# Altium footprint library Miscellaneous THD.PcbLib: 216 footprints (part 3 of 15) (continued)
## EPT_103-80004 [mm] "Right Angled Connector; DIN 41612, Type C/3, Thru-Hole; Rows a+b+c, 30 Male Contacts" (continued)
Mechanical 14:
  circle w0.1: c2.54,5.08 r1.25
  circle w0.1: c2.54,-27.94 r1.25
  lines w0.1: 2.04,-24.93 -0.31,-24.93 -0.31,-30.93 7.74,-30.93 7.74,-27.28 12.64,-27.28 12.64,4.32 7.74,4.32 7.74,8.07 -0.31,8.07 -0.31,2.07 2.04,2.07 ; 5.59,-30.93 5.59,8.07 ; 5.59,-25.14 2.04,-25.14 2.04,2.18 5.59,2.18
  text "b" at -2.94,1.48 h1.2
  text "c" at -5.465,1.48 h1.2
  text "10" at -8.327,-23.435 h1.2
  text "1" at -6.919,-0.725 h1.2
  text "5" at -7.304,-10.76 h1.2
3D body "EPT_103-80004.stp": height 9.35, standoff -3, extent -5.38,-30.93 12.64,8.07

## EPT_111-40064 [mm] "DIN 41612, Type G, 64 Contacts, Rows z/f+b+d, Performance level 2, Right Angle Male Connector"
height 16.4
pads (66):
  round 1.7 hole 1: b2(2.54,-2.54) b4(2.54,-7.62) b6(2.54,-12.7) b8(2.54,-17.78) b10(2.54,-22.86) b12(2.54,-27.94) b14(2.54,-33.02) b16(2.54,-38.1) b18(2.54,-43.18) b20(2.54,-48.26) b22(2.54,-53.34) b24(2.54,-58.42) b26(2.54,-63.5) b28(2.54,-68.58) b30(2.54,-73.66) b32(2.54,-78.74) d2(0,-2.54) d4(0,-7.62) d6(0,-12.7) d8(0,-17.78) d10(0,-22.86) d12(0,-27.94) d14(0,-33.02) d16(0,-38.1) d18(0,-43.18) d20(0,-48.26) d22(0,-53.34) d24(0,-58.42) d26(0,-63.5) d28(0,-68.58) d30(0,-73.66) d32(0,-78.74) f2(5.08,0) f4(5.08,-5.08) f6(5.08,-10.16) f8(5.08,-15.24) f10(5.08,-20.32) f12(5.08,-25.4) f14(5.08,-30.48) f16(5.08,-35.56) f18(5.08,-40.64) f20(5.08,-45.72) f22(5.08,-50.8) f24(5.08,-55.88) f26(5.08,-60.96) f28(5.08,-66.04) f30(5.08,-71.12) f32(5.08,-76.2) z2(5.08,-2.54) z4(5.08,-7.62) z6(5.08,-12.7) z8(5.08,-17.78) z10(5.08,-22.86) z12(5.08,-27.94) z14(5.08,-33.02) z16(5.08,-38.1) z18(5.08,-43.18) z20(5.08,-48.26) z22(5.08,-53.34) z24(5.08,-58.42) z26(5.08,-63.5) z28(5.08,-68.58) z30(5.08,-73.66) z32(5.08,-78.74)
  round 3.5 / inner round 3.5 / far side round 5.1 hole 2.8: MTG1(7.62,5.08) MTG2(7.62,-83.82)
Top Overlay:
  lines w0.2: -0.77,-79.725 -0.77,-81.32 5.13,-81.32 ; -0.77,-1.555 -0.77,2.58 5.13,2.58 ; 5.13,-84.568 5.13,-86.37 7.113,-86.37 ; 5.13,-83.072 5.13,-81.32 ; 5.13,4.332 5.13,2.58 ; 5.13,5.828 5.13,7.63 7.113,7.63 ; 6.906,-81.32 5.13,-81.32 ; 6.906,2.58 5.13,2.58 ; 8.127,-86.37 12.03,-86.37 12.03,-83.12 ; 8.127,7.63 12.03,7.63 12.03,4.38 ; 8.334,-81.32 12.03,-81.32 12.03,-83.12 ; 8.334,2.58 12.03,2.58 12.03,4.38 ; 12.03,-83.12 21.33,-83.12 21.33,-80.32 19.83,-80.32 19.83,1.58 21.33,1.58 21.33,4.38 12.03,4.38
  text "30" at -3.203,-74.295 h1.2
  text "10" at -3.06,-23.495 h1.2
  text "32" at -3.203,-79.375 h1.2
  text "b" at 2.047,1.34 h1.2
  text "z/f" at 4.588,1.34 h1.2
  text "d" at -0.493,1.34 h1.2
  text "2" at -2.145,-3.05 h1.2
  text "20" at -3.21,-48.87 h1.2
Mechanical 8:
  drawing of 269 lines, arcs and shapes, not listed
Mechanical 14:
  lines w0.1: 5.13,-81.32 5.13,-86.37 12.03,-86.37 12.03,-83.12 ; 5.13,-81.32 -0.77,-81.32 -0.77,2.58 5.13,2.58 ; 5.13,-81.32 12.03,-81.32 12.03,-83.12 ; 5.13,2.58 5.13,7.63 12.03,7.63 12.03,4.38 ; 5.13,2.58 12.03,2.58 12.03,4.38 ; 12.03,-83.12 21.33,-83.12 21.33,-80.32 19.83,-80.32 19.83,1.58 21.33,1.58 21.33,4.38 12.03,4.38
  text "32" at -3.203,-79.375 h1.2
  text "10" at -3.06,-23.495 h1.2
  text "30" at -3.203,-74.295 h1.2
  text "2" at -2.145,-3.05 h1.2
  text "20" at -3.21,-48.87 h1.2
3D body "EPT_111-40064.stp": height 16.4, standoff -3.4, extent -0.77,-86.37 21.33,7.63

## EPT_112-40064 [mm] "DIN 41612, Type G, 64 Contacts, Rows z+b+d+f, Performance level 2, Straight Femalele Connector"
height 20
pads (66):
  round 2.3 hole 1.6: b2(5.08,0) b4(5.08,-5.08) b6(5.08,-10.16) b8(5.08,-15.24) b10(5.08,-20.32) b12(5.08,-25.4) b14(5.08,-30.48) b16(5.08,-35.56) b18(5.08,-40.64) b20(5.08,-45.72) b22(5.08,-50.8) b24(5.08,-55.88) b26(5.08,-60.96) b28(5.08,-66.04) b30(5.08,-71.12) b32(5.08,-76.2) d2(10.16,0) d4(10.16,-5.08) d6(10.16,-10.16) d8(10.16,-15.24) d10(10.16,-20.32) d12(10.16,-25.4) d14(10.16,-30.48) d16(10.16,-35.56) d18(10.16,-40.64) d20(10.16,-45.72) d22(10.16,-50.8) d24(10.16,-55.88) d26(10.16,-60.96) d28(10.16,-66.04) d30(10.16,-71.12) d32(10.16,-76.2) f2(15.24,0) f4(15.24,-5.08) f6(15.24,-10.16) f8(15.24,-15.24) f10(15.24,-20.32) f12(15.24,-25.4) f14(15.24,-30.48) f16(15.24,-35.56) f18(15.24,-40.64) f20(15.24,-45.72) f22(15.24,-50.8) f24(15.24,-55.88) f26(15.24,-60.96) f28(15.24,-66.04) f30(15.24,-71.12) f32(15.24,-76.2) z2(0,0) z4(0,-5.08) z6(0,-10.16) z8(0,-15.24) z10(0,-20.32) z12(0,-25.4) z14(0,-30.48) z16(0,-35.56) z18(0,-40.64) z20(0,-45.72) z22(0,-50.8) z24(0,-55.88) z26(0,-60.96) z28(0,-66.04) z30(0,-71.12) z32(0,-76.2)
  round 3.5 / inner round 3.5 / far side round 5.1 hole 2.8: MTG1(4.78,8.17) MTG2(4.78,-81.83)
Top Overlay:
  lines w0.2: -1.08,-77.312 -1.08,-79.03 ; -1.08,1.112 -1.08,5.37 ; -0.58,-77.637 -0.58,-78.53 ; -0.58,1.437 -0.58,4.87 ; 0,-77.75 0,-78.53 ; 0,1.55 0,4.87 ; 0.453,-79.03 0,-78.53 ; 0.453,5.37 0,4.87 ; 0.77,-79.03 0.77,-77.545 ; 0.77,1.345 0.77,5.37 ; 1.77,-79.03 1.77,5.37 ; 2.087,-79.03 2.54,-78.53 ; 2.087,5.37 2.54,4.87 ; 3.76,-84.33 -2.28,-84.33 -2.28,10.67 3.76,10.67 ; 3.81,-77.089 3.81,-78.53 ; 3.81,0.889 3.81,4.87 ; 4.263,-79.03 3.81,-78.53 ; 4.263,5.37 3.81,4.87 ; 4.58,-79.03 4.58,-77.667 ; 4.58,1.467 4.58,5.37 ; 5.58,-79.03 5.58,-77.667 ; 5.58,1.467 5.58,5.37 ; 5.8,-84.33 17.52,-84.33 17.52,10.67 5.8,10.67 ; 5.897,-79.03 6.35,-78.53 ; 5.897,5.37 6.35,4.87 ; 6.35,-77.089 6.35,-78.53 ; 6.35,0.889 6.35,4.87 ; 8.073,-79.03 7.62,-78.53 ; 8.073,5.37 7.62,4.87 ; 8.39,-79.03 8.39,5.37 ; 9.39,-79.03 9.39,-77.545 ; 9.39,1.345 9.39,5.37 ; 9.707,-79.03 10.16,-78.53 ; 9.707,5.37 10.16,4.87 ; 10.16,-77.75 10.16,-78.53 ; 10.16,1.55 10.16,4.87 ; 13.153,-79.03 12.7,-78.53 ; 13.153,5.37 12.7,4.87 ; 13.47,-79.03 13.47,5.37 ; 14.47,-79.03 14.47,-77.545 ; 14.47,1.345 14.47,5.37 ; 14.787,-79.03 15.24,-78.53 ; 14.787,5.37 15.24,4.87 ; 15.24,-77.75 15.24,-78.53 ; 15.24,1.55 15.24,4.87 ; 15.82,-77.637 15.82,-78.53 ; 15.82,1.437 15.82,4.87 ; 16.32,-77.312 16.32,-79.03 ; 16.32,1.112 16.32,5.37 ; -1.08,-79.03 -0.58,-78.53 ; -1.08,-79.03 -0.58,-78.53 ; -1.08,-79.03 16.32,-79.03 ; -1.08,5.37 -0.58,4.87 ; -1.08,5.37 16.32,5.37 ; -0.58,-78.53 0,-78.53 ; -0.58,4.87 0,4.87 ; 2.54,-78.53 2.54,4.87 ; 2.54,-78.53 3.81,-78.53 ; 2.54,4.87 3.81,4.87 ; 2.54,4.87 3.81,4.87 ; 6.35,-78.53 7.62,-78.53 ; 6.35,4.87 7.62,4.87 ; 7.62,-78.53 7.62,4.87 ; 10.16,-78.53 12.7,-78.53 ; 10.16,4.87 12.7,4.87 ; 12.7,-78.53 12.7,4.87 ; 15.24,-78.53 15.82,-78.53 ; 15.24,4.87 15.82,4.87 ; 15.82,-78.53 16.32,-79.03 ; 15.82,4.87 16.32,5.37
  text "b" at 7.545,5.925 h1.2
  text "f" at 15.125,6 h1.2
  text "d" at 10.07,5.925 h1.2
  text "z" at -0.58,6.125 h1.2
  text "5" at -3.732,-8.305 h1.2
  text "30" at -5.002,-71.805 h1.2
  text "25" at -5.002,-59.105 h1.2
  text "20" at -5.002,-46.405 h1.2
  text "15" at -4.685,-33.705 h1.2
  text "10" at -4.685,-21.005 h1.2
  text "32" at -5.002,-76.885 h1.2
  text "1" at -3.415,1.855 h1.2
Mechanical 8:
  drawing of 269 lines, arcs and shapes, not listed
Mechanical 14:
  lines w0.1: 0.453,-79.03 0,-78.53 ; 0.453,5.37 0,4.87 ; 0.77,-79.03 0.77,5.37 ; 1.77,-79.03 1.77,5.37 ; 2.087,-79.03 2.54,-78.53 ; 2.087,5.37 2.54,4.87 ; 4.263,-79.03 3.81,-78.53 ; 4.263,5.37 3.81,4.87 ; 4.58,-79.03 4.58,5.37 ; 5.58,-79.03 5.58,5.37 ; 5.897,-79.03 6.35,-78.53 ; 5.897,5.37 6.35,4.87 ; 8.073,-79.03 7.62,-78.53 ; 8.073,5.37 7.62,4.87 ; 8.39,-79.03 8.39,5.37 ; 9.39,-79.03 9.39,5.37 ; 9.707,-79.03 10.16,-78.53 ; 9.707,5.37 10.16,4.87 ; 13.153,-79.03 12.7,-78.53 ; 13.153,5.37 12.7,4.87 ; 13.47,-79.03 13.47,5.37 ; 14.47,-79.03 14.47,5.37 ; 14.787,-79.03 15.24,-78.53 ; 14.787,5.37 15.24,4.87 ; -1.08,-79.03 -0.58,-78.53 ; -1.08,-79.03 -0.58,-78.53 ; -1.08,-79.03 -1.08,5.37 ; -1.08,-79.03 16.32,-79.03 ; -1.08,5.37 -0.58,4.87 ; -1.08,5.37 16.32,5.37 ; -0.58,-78.53 0,-78.53 ; -0.58,-78.53 -0.58,4.87 ; -0.58,4.87 0,4.87 ; 0,-78.53 0,4.87 ; 2.54,-78.53 2.54,4.87 ; 2.54,-78.53 3.81,-78.53 ; 2.54,4.87 3.81,4.87 ; 2.54,4.87 3.81,4.87 ; 3.81,-78.53 3.81,4.87 ; 6.35,-78.53 6.35,4.87 ; 6.35,-78.53 7.62,-78.53 ; 6.35,4.87 7.62,4.87 ; 7.62,-78.53 7.62,4.87 ; 10.16,-78.53 12.7,-78.53 ; 10.16,-78.53 10.16,4.87 ; 10.16,4.87 12.7,4.87 ; 12.7,-78.53 12.7,4.87 ; 15.24,-78.53 15.82,-78.53 ; 15.24,-78.53 15.24,4.87 ; 15.24,4.87 15.82,4.87 ; 15.82,-78.53 16.32,-79.03 ; 15.82,-78.53 15.82,4.87 ; 15.82,4.87 16.32,5.37 ; 16.32,-79.03 16.32,5.37 ; -2.28,-84.33 17.52,-84.33 17.52,10.67 -2.28,10.67 -2.28,-84.33
  text "z" at -0.58,6.125 h1.2
  text "d" at 10.07,5.925 h1.2
  text "f" at 15.125,6 h1.2
  text "b" at 7.545,5.925 h1.2
  text "1" at -3.415,1.855 h1.2
  text "32" at -5.002,-76.885 h1.2
  text "10" at -4.685,-21.005 h1.2
  text "15" at -4.685,-33.705 h1.2
  text "20" at -5.002,-46.405 h1.2
  text "25" at -5.002,-59.105 h1.2
  text "30" at -5.002,-71.805 h1.2
  text "5" at -3.732,-8.305 h1.2
  text "5" at -3.732,-8.305 h1.2
  text "30" at -5.002,-71.805 h1.2
  text "25" at -5.002,-59.105 h1.2
  text "20" at -5.002,-46.405 h1.2
  text "15" at -4.685,-33.705 h1.2
  text "10" at -4.685,-21.005 h1.2
  text "32" at -5.002,-76.885 h1.2
  text "1" at -3.415,1.855 h1.2
  text "1" at -3.415,1.855 h1.2
  text "32" at -5.002,-76.885 h1.2
  text "10" at -4.685,-21.005 h1.2
  text "15" at -4.685,-33.705 h1.2
  text "20" at -5.002,-46.405 h1.2
  text "25" at -5.002,-59.105 h1.2
  text "30" at -5.002,-71.805 h1.2
  text "5" at -3.732,-8.305 h1.2
3D body "EPT_112-40064.stp": height 20, standoff -4.5, extent -2.28,-84.33 17.52,10.67

## EPT_113-40010 [mm] "DIN 41612, DIN41612 Type H, 11 Positions, Right Angle Male Connector, Pitch 7.62 mm"
height 11
pads (13):
  round 2.3 hole 1.6: 2(0,0) 5(0,-7.62) 8(0,-15.24) 11(0,-22.86) 14(0,-30.48) 17(0,-38.1) 20(0,-45.72) 23(0,-53.34) 26(0,-60.96) 29(0,-68.58) 32(0,-76.2)
  round 3.5 / inner round 3.5 / far side round 5.1 hole 2.8: MTG1(12.7,7.62) MTG2(12.7,-81.28)
Top Overlay:
  lines w0.2: 10.3,-82.568 10.3,-83.83 17.6,-83.83 17.6,-80.83 27,-80.83 27,7.17 17.6,7.17 17.6,10.17 10.3,10.17 10.3,8.907 ; 10.3,-80.043 10.3,-78.78 ; 10.3,5.12 10.3,6.382 ; 11.5,-78.78 -1.6,-78.78 -1.6,5.12 11.5,5.12 ; 14,-78.78 15.7,-78.78 15.7,-83.83 ; 14,5.12 15.7,5.12 15.7,10.17 ; 27,-66.1 25.3,-66.1 25.3,-65.05 27,-65.05 ; 27,-61.95 25.3,-61.95 25.3,-60.9 27,-60.9 ; 27,-50.86 25.3,-50.86 25.3,-49.81 27,-49.81 ; 27,-46.71 25.3,-46.71 25.3,-45.66 27,-45.66 ; 27,-35.62 25.3,-35.62 25.3,-34.57 27,-34.57 ; 27,-31.47 25.3,-31.47 25.3,-30.42 27,-30.42 ; 27,-20.38 25.3,-20.38 25.3,-19.33 27,-19.33 ; 27,-16.23 25.3,-16.23 25.3,-15.18 27,-15.18
  text "32" at -3.78,-76.835 h1.2
  text "29" at -3.78,-69.215 h1.2
  text "26" at -3.78,-61.595 h1.2
  text "23" at -3.78,-53.975 h1.2
  text "20" at -3.78,-46.355 h1.2
  text "17" at -3.78,-38.735 h1.2
  text "14" at -3.78,-31.115 h1.2
  text "11" at -3.78,-23.495 h1.2
  text "8" at -3.145,-15.875 h1.2
  text "5" at -3.145,-8.255 h1.2
  text "2" at -3.145,-0.635 h1.2
Mechanical 8:
  circle w0.2: c0,-76.2 r0.8
  circle w0.2: c12.7,-81.28 r1.4
  circle w0.2: c0,-68.58 r0.8
  circle w0.2: c0,-60.96 r0.8
  circle w0.2: c12.7,7.62 r1.4
  circle w0.2: c0,-53.34 r0.8
  circle w0.2: c0,-45.72 r0.8
  circle w0.2: c0,-38.1 r0.8
  circle w0.2: c0,-30.48 r0.8
  circle w0.2: c0,-22.86 r0.8
  circle w0.2: c0,-15.24 r0.8
  circle w0.2: c0,-7.62 r0.8
  circle w0.2: c0,0 r0.8
  lines w0.2: 0,-77.4 0,-76.2 1.2,-76.2 ; 0,-69.78 0,-68.58 1.2,-68.58 ; 0,-62.16 0,-60.96 1.2,-60.96 ; 0,-54.54 0,-53.34 1.2,-53.34 ; 0,-46.92 0,-45.72 1.2,-45.72 ; 0,-39.3 0,-38.1 1.2,-38.1 ; 0,-31.68 0,-30.48 1.2,-30.48 ; 0,-24.06 0,-22.86 1.2,-22.86 ; 0,-16.44 0,-15.24 1.2,-15.24 ; 0,-8.82 0,-7.62 1.2,-7.62 ; 0,-1.2 0,0 1.2,0 ; 10.795,-36.83 12.7,-36.83 12.7,-38.735 ; 12.7,-83.38 12.7,-81.28 14.8,-81.28 ; 12.7,5.52 12.7,7.62 14.8,7.62 ; 15,-83.83 15,-40.005 ; 15,-33.655 15,10.17
  text "PCB" at 15.875,-38.735 h1.5
Mechanical 14:
  lines w0.1: 10.3,-78.78 10.3,-83.83 17.6,-83.83 17.6,-80.83 27,-80.83 27,7.17 17.6,7.17 17.6,10.17 10.3,10.17 10.3,5.12 ; 15.7,-83.83 15.7,-78.78 -1.6,-78.78 -1.6,5.12 15.7,5.12 15.7,10.17 ; 27,-66.1 25.3,-66.1 25.3,-65.05 27,-65.05 ; 27,-61.95 25.3,-61.95 25.3,-60.9 27,-60.9 ; 27,-50.86 25.3,-50.86 25.3,-49.81 27,-49.81 ; 27,-46.71 25.3,-46.71 25.3,-45.66 27,-45.66 ; 27,-35.62 25.3,-35.62 25.3,-34.57 27,-34.57 ; 27,-31.47 25.3,-31.47 25.3,-30.42 27,-30.42 ; 27,-20.38 25.3,-20.38 25.3,-19.33 27,-19.33 ; 27,-16.23 25.3,-16.23 25.3,-15.18 27,-15.18
3D body "EPT_113-40010.stp": height 9.5, standoff -3.5, extent -1.6,-83.83 27,10.17

## EPT_304-80064-01 [mm] "Connector; DIN 41612, Type C/3, Thru-Hole; Rows a+b+c, 30 Male Contacts"
height 11.6
pads (32):
  round 1.7 hole 1: a1(0,0) a2(0,-2.54) a3(0,-5.08) a4(0,-7.62) a5(0,-10.16) a6(0,-12.7) a7(0,-15.24) a8(0,-17.78) a9(0,-20.32) a10(0,-22.86) b1(2.54,0) b2(2.54,-2.54) b3(2.54,-5.08) b4(2.54,-7.62) b5(2.54,-10.16) b6(2.54,-12.7) b7(2.54,-15.24) b8(2.54,-17.78) b9(2.54,-20.32) b10(2.54,-22.86) c1(5.08,0) c2(5.08,-2.54) c3(5.08,-5.08) c4(5.08,-7.62) c5(5.08,-10.16) c6(5.08,-12.7) c7(5.08,-15.24) c8(5.08,-17.78) c9(5.08,-20.32) c10(5.08,-22.86)
  round 3.5 / inner round 3.5 / far side round 5.1 hole 2.8: MTG1(2.24,5.57) MTG2(2.24,-28.43)
Top Overlay:
  lines w0.2: -1.685,-20.819 -1.285,-21.05 -1.285,-17.05 -1.685,-17.281 ; -1.685,-5.579 -1.285,-5.81 -1.285,-1.81 -1.685,-2.041 ; -1.61,-30.93 -1.61,-26.03 ; -1.61,3.17 -1.61,8.07 ; -1.085,-23.241 -1.085,-25.43 ; -1.085,0.381 -1.085,2.57 ; -0.285,-26.03 -0.285,-24.4 2.265,-24.4 2.265,-25.65 ; -0.285,-25.43 -1.085,-25.43 ; -0.285,2.57 -1.085,2.57 ; -0.285,3.17 -0.285,1.54 2.265,1.54 2.265,2.825 ; 0.125,3.17 -1.685,3.17 ; 0.675,-30.93 -2.71,-30.93 -2.71,8.07 0.675,8.07 ; 0.775,-26.03 -1.685,-26.03 ; 2.265,-25.43 3.065,-25.43 ; 2.265,2.57 3.065,2.57 ; 3.8,-30.93 7.79,-30.93 7.79,8.07 3.8,8.07 ; 4.23,-26.03 6.69,-26.03 ; 4.23,3.17 6.69,3.17 ; 6.165,-23.241 6.165,-24.38 ; 6.165,0.381 6.165,1.52 ; 6.69,-30.93 6.69,-24.98 ; 6.69,2.12 6.69,8.07 ; 6.765,-20.819 6.365,-21.05 6.365,-17.05 6.765,-17.281 ; 6.765,-5.579 6.365,-5.81 6.365,-1.81 6.765,-2.041 ; -1.685,-26.03 -1.685,3.17 ; -1.685,-26.03 -1.085,-25.43 ; -1.685,3.17 -1.085,2.57 ; 3.065,-25.43 3.065,-24.38 ; 3.065,-25.43 3.665,-26.03 3.665,-24.98 ; 3.065,-24.38 6.165,-24.38 ; 3.065,-24.38 3.665,-24.98 ; 3.065,1.52 3.665,2.12 ; 3.065,1.52 3.065,2.57 ; 3.065,1.52 6.165,1.52 ; 3.065,2.57 3.665,3.17 3.665,2.12 ; 3.665,-24.98 4.125,-24.98 4.125,-24.4 5.665,-24.4 5.665,-24.98 6.765,-24.98 ; 3.665,2.12 4.125,2.12 4.125,1.54 5.665,1.54 5.665,2.12 6.765,2.12 ; 6.165,-24.38 6.765,-24.98 ; 6.165,1.52 6.765,2.12 ; 6.765,-24.98 6.765,2.12
  text "c" at 4.475,1.925 h1.2
  text "10" at -5.172,-23.535 h1.2
  text "5" at -4.174,-10.885 h1.2
  text "1" at -3.839,-0.725 h1.2
  text "a" at 0.525,2.05 h1.2
Mechanical 8:
  lines w0.1: -0.5,-22.86 0,-22.86 ; -0.5,-20.32 0,-20.32 ; -0.5,-17.78 0,-17.78 ; -0.5,-15.24 0,-15.24 ; -0.5,-12.7 0,-12.7 ; -0.5,-10.16 0,-10.16 ; -0.5,-7.62 0,-7.62 ; -0.5,-5.08 0,-5.08 ; -0.5,-2.54 0,-2.54 ; -0.5,0 0,0 ; 0,-23.36 0,-22.86 ; 0,-22.36 0,-22.86 ; 0,-20.82 0,-20.32 ; 0,-19.82 0,-20.32 ; 0,-18.28 0,-17.78 ; 0,-17.28 0,-17.78 ; 0,-15.74 0,-15.24 ; 0,-14.74 0,-15.24 ; 0,-13.2 0,-12.7 ; 0,-12.2 0,-12.7 ; 0,-10.66 0,-10.16 ; 0,-9.66 0,-10.16 ; 0,-8.12 0,-7.62 ; 0,-7.12 0,-7.62 ; 0,-5.58 0,-5.08 ; 0,-4.58 0,-5.08 ; 0,-3.04 0,-2.54 ; 0,-2.04 0,-2.54 ; 0,-0.5 0,0 ; 0,0.5 0,0 ; 0.5,-22.86 0,-22.86 ; 0.5,-20.32 0,-20.32 ; 0.5,-17.78 0,-17.78 ; 0.5,-15.24 0,-15.24 ; 0.5,-12.7 0,-12.7 ; 0.5,-10.16 0,-10.16 ; 0.5,-7.62 0,-7.62 ; 0.5,-5.08 0,-5.08 ; 0.5,-2.54 0,-2.54 ; 0.5,0 0,0 ; 1.74,-28.43 2.24,-28.43 ; 1.74,5.57 2.24,5.57 ; 2.04,-22.86 2.54,-22.86 ; 2.04,-20.32 2.54,-20.32 ; 2.04,-17.78 2.54,-17.78 ; 2.04,-15.24 2.54,-15.24 ; 2.04,-12.7 2.54,-12.7 ; 2.04,-11.43 2.54,-11.43 ; 2.04,-10.16 2.54,-10.16 ; 2.04,-7.62 2.54,-7.62 ; 2.04,-5.08 2.54,-5.08 ; 2.04,-2.54 2.54,-2.54 ; 2.04,0 2.54,0 ; 2.24,-28.93 2.24,-28.43 ; 2.24,-27.93 2.24,-28.43 ; 2.24,5.07 2.24,5.57 ; 2.24,6.07 2.24,5.57 ; 2.54,-23.36 2.54,-22.86 ; 2.54,-22.36 2.54,-22.86 ; 2.54,-20.82 2.54,-20.32 ; 2.54,-19.82 2.54,-20.32 ; 2.54,-18.28 2.54,-17.78 ; 2.54,-17.28 2.54,-17.78 ; 2.54,-15.74 2.54,-15.24 ; 2.54,-14.74 2.54,-15.24 ; 2.54,-13.2 2.54,-12.7 ; 2.54,-12.2 2.54,-12.7 ; 2.54,-11.93 2.54,-11.43 ; 2.54,-10.93 2.54,-11.43 ; 2.54,-10.66 2.54,-10.16 ; 2.54,-9.66 2.54,-10.16 ; 2.54,-8.12 2.54,-7.62 ; 2.54,-7.12 2.54,-7.62 ; 2.54,-5.58 2.54,-5.08 ; 2.54,-4.58 2.54,-5.08 ; 2.54,-3.04 2.54,-2.54 ; 2.54,-2.04 2.54,-2.54 ; 2.54,-0.5 2.54,0 ; 2.54,0.5 2.54,0 ; 2.74,-28.43 2.24,-28.43 ; 2.74,5.57 2.24,5.57 ; 3.04,-22.86 2.54,-22.86 ; 3.04,-20.32 2.54,-20.32 ; 3.04,-17.78 2.54,-17.78 ; 3.04,-15.24 2.54,-15.24 ; 3.04,-12.7 2.54,-12.7 ; 3.04,-11.43 2.54,-11.43 ; 3.04,-10.16 2.54,-10.16 ; 3.04,-7.62 2.54,-7.62 ; 3.04,-5.08 2.54,-5.08 ; 3.04,-2.54 2.54,-2.54 ; 3.04,0 2.54,0 ; 4.58,-22.86 5.08,-22.86 ; 4.58,-20.32 5.08,-20.32 ; 4.58,-17.78 5.08,-17.78 ; 4.58,-15.24 5.08,-15.24 ; 4.58,-12.7 5.08,-12.7 ; 4.58,-10.16 5.08,-10.16 ; 4.58,-7.62 5.08,-7.62 ; 4.58,-5.08 5.08,-5.08 ; 4.58,-2.54 5.08,-2.54 ; 4.58,0 5.08,0 ; 5.08,-23.36 5.08,-22.86 ; 5.08,-22.36 5.08,-22.86 ; 5.08,-20.82 5.08,-20.32 ; 5.08,-19.82 5.08,-20.32 ; 5.08,-18.28 5.08,-17.78 ; 5.08,-17.28 5.08,-17.78 ; 5.08,-15.74 5.08,-15.24 ; 5.08,-14.74 5.08,-15.24 ; 5.08,-13.2 5.08,-12.7 ; 5.08,-12.2 5.08,-12.7 ; 5.08,-10.66 5.08,-10.16 ; 5.08,-9.66 5.08,-10.16 ; 5.08,-8.12 5.08,-7.62 ; 5.08,-7.12 5.08,-7.62 ; 5.08,-5.58 5.08,-5.08 ; 5.08,-4.58 5.08,-5.08 ; 5.08,-3.04 5.08,-2.54 ; 5.08,-2.04 5.08,-2.54 ; 5.08,-0.5 5.08,0 ; 5.08,0.5 5.08,0 ; 5.58,-22.86 5.08,-22.86 ; 5.58,-20.32 5.08,-20.32 ; 5.58,-17.78 5.08,-17.78 ; 5.58,-15.24 5.08,-15.24 ; 5.58,-12.7 5.08,-12.7 ; 5.58,-10.16 5.08,-10.16 ; 5.58,-7.62 5.08,-7.62 ; 5.58,-5.08 5.08,-5.08 ; 5.58,-2.54 5.08,-2.54 ; 5.58,0 5.08,0
Mechanical 14:
  drawing of 422 lines, arcs and shapes, not listed
  text "c" at 4.475,1.925 h1.2
  text "a" at 0.525,2.05 h1.2
  text "10" at -5.172,-23.535 h1.2
  text "1" at -3.839,-0.725 h1.2
  text "5" at -4.174,-10.885 h1.2
3D body "EPT_304-80064-01.stp": height 11.45, standoff -3.4, extent -2.71,-30.93 7.79,8.07

## EPT_930-61040 [mm] "4 Contact, 2.54mm Pitch, Single Row Socket Connector"
height 4.8
pads (4):
  rect 1.7x1.7 hole 1: 1(0,0)
  round 1.7 hole 1: 2(2.54,0) 3(5.08,0) 4(7.62,0)
Top Overlay:
  circle w0.3: c-0.508,1.778 r0.15
  lines w0.2: -1.2,-0.82 -1.27,-0.75 -1.27,0.75 -1.2,0.82 ; -0.82,-1.2 -0.77,-1.25 0.77,-1.25 0.82,-1.2 ; -0.82,1.2 -0.77,1.25 0.77,1.25 0.82,1.2 ; 1.2,-0.82 1.27,-0.75 ; 1.2,0.82 1.27,0.75 ; 1.27,-0.75 1.27,0.75 ; 1.27,-0.75 1.77,-1.25 3.31,-1.25 3.81,-0.75 ; 1.27,0.75 1.77,1.25 3.31,1.25 3.81,0.75 ; 3.81,-0.75 3.81,0.75 ; 3.81,-0.75 4.31,-1.25 5.85,-1.25 6.35,-0.75 ; 3.81,0.75 4.31,1.25 5.85,1.25 6.35,0.75 ; 6.35,-0.75 6.35,0.75 ; 6.35,-0.75 6.85,-1.25 8.39,-1.25 8.89,-0.75 8.89,0.75 8.39,1.25 6.85,1.25 6.35,0.75
Mechanical 8:
  lines w0.1: -0.5,0 0,0 ; 0,-0.5 0,0 ; 0,0.5 0,0 ; 0.5,0 0,0 ; 2.04,0 2.54,0 ; 2.54,-0.5 2.54,0 ; 2.54,0.5 2.54,0 ; 3.04,0 2.54,0 ; 4.58,0 5.08,0 ; 5.08,-0.5 5.08,0 ; 5.08,0.5 5.08,0 ; 5.58,0 5.08,0 ; 7.12,0 7.62,0 ; 7.62,-0.5 7.62,0 ; 7.62,0.5 7.62,0 ; 8.12,0 7.62,0
Mechanical 14:
  circle w0.3: c-0.508,1.778 r0.15
  lines w0.1: 1.27,-0.75 1.27,0.75 ; 1.27,-0.75 0.77,-1.25 -0.77,-1.25 -1.27,-0.75 -1.27,0.75 -0.77,1.25 0.77,1.25 1.27,0.75 ; 1.27,-0.75 1.77,-1.25 3.31,-1.25 3.81,-0.75 ; 1.27,0.75 1.77,1.25 3.31,1.25 3.81,0.75 ; 3.81,-0.75 3.81,0.75 ; 3.81,-0.75 4.31,-1.25 5.85,-1.25 6.35,-0.75 ; 3.81,0.75 4.31,1.25 5.85,1.25 6.35,0.75 ; 6.35,-0.75 6.35,0.75 ; 6.35,-0.75 6.85,-1.25 8.39,-1.25 8.89,-0.75 8.89,0.75 8.39,1.25 6.85,1.25 6.35,0.75
Drill Drawing:
  lines w0.1: -1.27,-1.25 -1.27,1.25 8.89,1.25 8.89,-1.25 -1.27,-1.25
  text "PRESS-FIT TECHNOLOGY" at -5.15,1.6 h1
  text "Diam. 1mm +0.09/-0.06" at -5.4,-2.65 h1
3D body "EPT_930-61040.stp": height 4.8, standoff -3.6, extent -1.27,-1.25 8.89,1.25